# Altium footprint library Reflow3D1411sep.PcbLib: 657 footprints (part 1 of 42)
Each footprint in its own frame and in the unit in brackets; x right, y up, seen from the top. Pads: shape width x height; smd on the part's side, far side on the other; paste and mask are expansions set on the pad; w line width, h text height; cw(c..) or ccw(c..) is an arc to the next point about the centre after c.
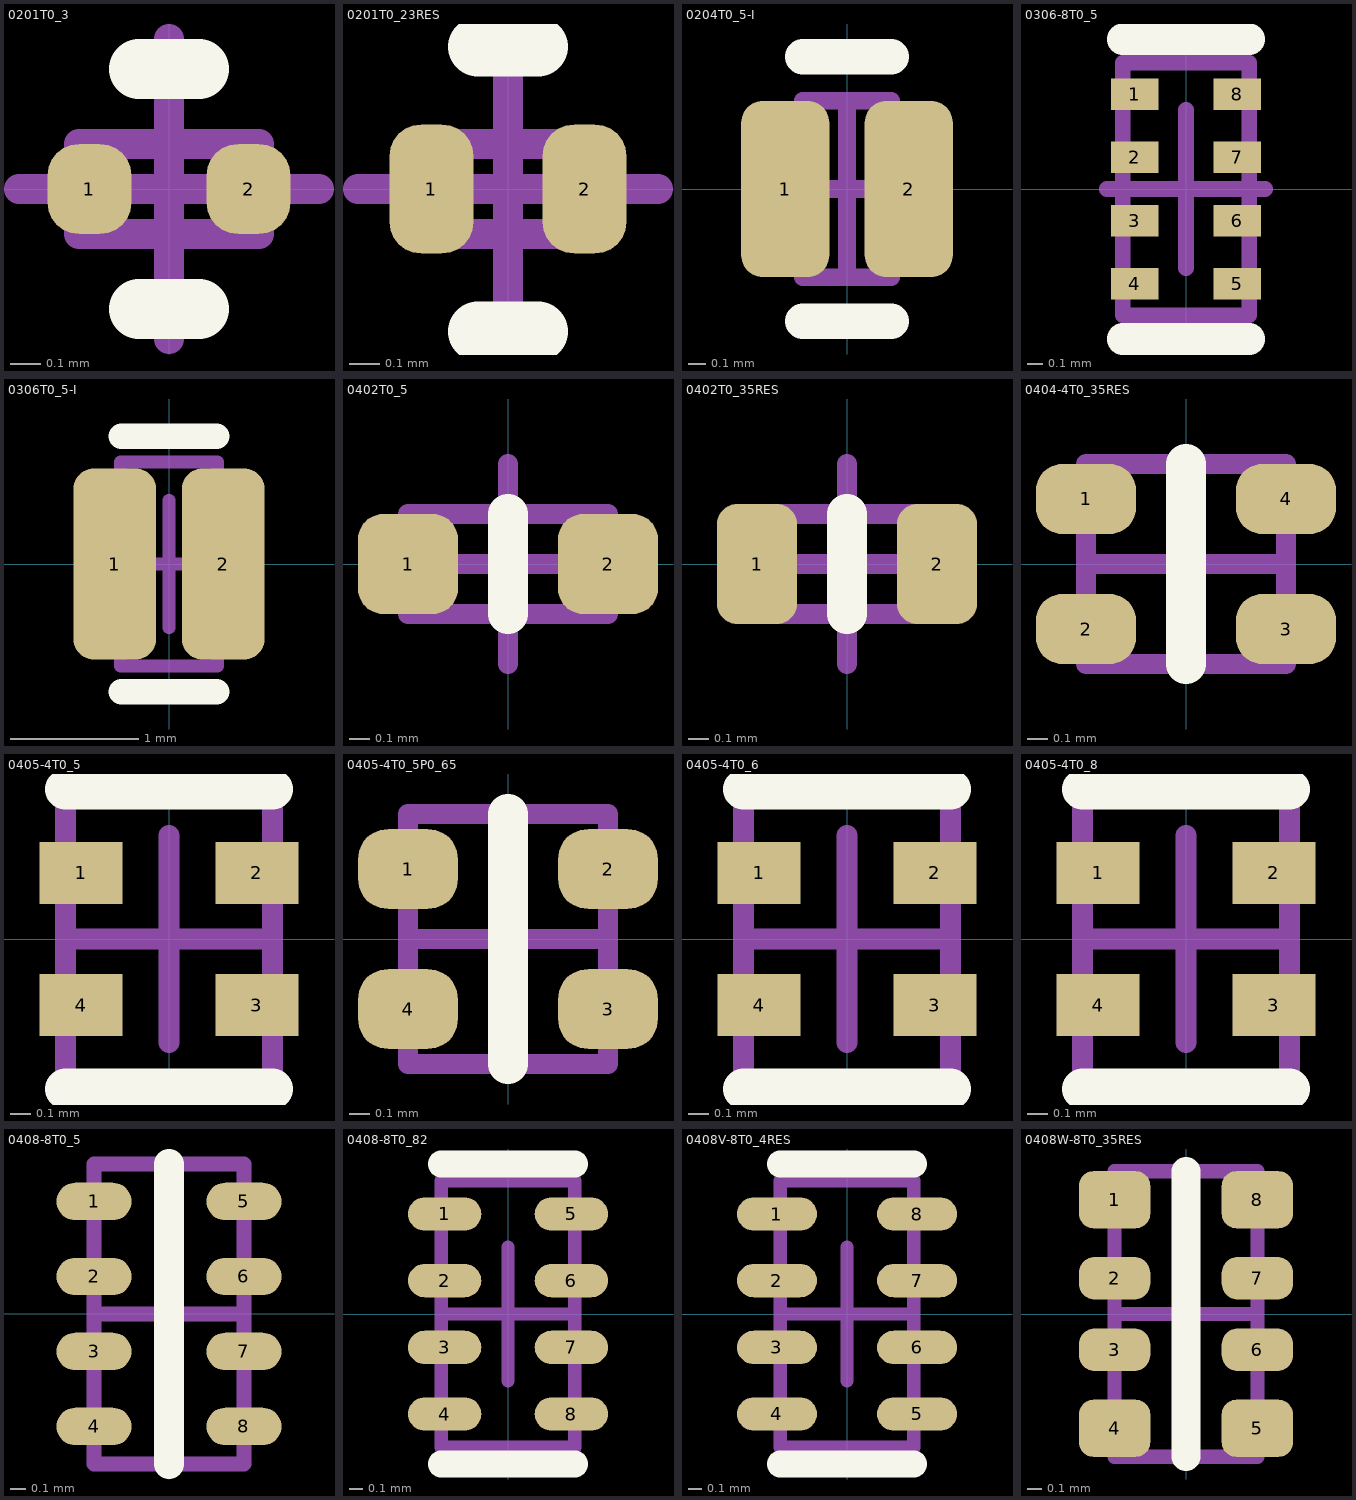
[diagram p0: the footprints below, top view; thin cyan lines are the x and y axes]

## 0201T0_3 [mm] "www.yageo.com, UPY-C_GEN_12.pdf; www.kemet.com, F3102_C0G.pdf"
height 0.3
pads (2):
  rrect75% 0.28x0.3 smd mask+0.05: 1(-0.265,0) 2(0.265,0)
Top Overlay:
  lines w0.2: -0.1,-0.4 0.1,-0.4 ; -0.1,0.4 0.1,0.4
Mechanical 13:
  lines w0.1: -0.3,-0.15 -0.3,0.15 0.3,0.15 0.3,-0.15 -0.3,-0.15
Mechanical 15:
  lines w0.1: -0.5,0 0.5,0 ; 0,-0.5 0,0.5
3D body: height 0.33, standoff 0, extent -0.315,-0.165 0.315,0.165

## 0201T0_23RES [mm] "www.vishay.com, dcrcwe3.pdf"
height 0.23
pads (2):
  rrect75% 0.28x0.43 smd mask+0.05: 1(-0.255,0) 2(0.255,0)
Top Overlay:
  lines w0.2: -0.1,-0.475 0.1,-0.475 ; -0.1,0.475 0.1,0.475
Mechanical 13:
  lines w0.1: -0.3,-0.15 -0.3,0.15 0.3,0.15 0.3,-0.15 -0.3,-0.15
Mechanical 15:
  lines w0.1: -0.5,0 0.5,0 ; 0,-0.5 0,0.5
3D body: height 0.28, standoff 0, extent -0.325,-0.175 0.325,0.175

## 0204T0_5-I [mm] "www.avx.com, smccp.pdf, LG12"
height 0.5
pads (2):
  rrect50% 0.5x1 smd mask+0.05: 1(-0.35,0) 2(0.35,0)
Top Overlay:
  lines w0.2: -0.25,-0.75 0.25,-0.75 ; -0.25,0.75 0.25,0.75
Mechanical 13:
  lines w0.1: -0.25,-0.5 -0.25,0.5 0.25,0.5 0.25,-0.5 -0.25,-0.5
Mechanical 15:
  lines w0.1: -0.5,0 0.5,0 ; 0,-0.5 0,0.5
3D body: height 0.55, standoff 0, extent -0.275,-0.55 0.275,0.55

## 0306-8T0_5 [mm] "www.murata.com, c02e.pdf, LLA185"
height 0.5
pads (8):
  rect 0.3x0.2 smd mask+0.05: 1(-0.325,0.6) 2(-0.325,0.2) 3(-0.325,-0.2) 4(-0.325,-0.6) 5(0.325,-0.6) 6(0.325,-0.2) 7(0.325,0.2) 8(0.325,0.6)
Top Overlay:
  lines w0.2: -0.4,-0.95 0.4,-0.95 ; -0.4,0.95 0.4,0.95
Mechanical 13:
  lines w0.1: -0.4,-0.8 -0.4,0.8 0.4,0.8 0.4,-0.8 -0.4,-0.8
Mechanical 15:
  lines w0.1: -0.5,0 0.5,0 ; 0,-0.5 0,0.5
3D body: height 0.55, standoff 0, extent -0.45,-0.85 0.45,0.85

## 0306T0_5-I [mm] "www.avx.com, smccp.pdf, LG22"
height 0.5
pads (2):
  rrect50% 0.65x1.5 smd mask+0.05: 1(-0.425,0) 2(0.425,0)
Top Overlay:
  lines w0.2: -0.375,-1 0.375,-1 ; -0.375,1 0.375,1
Mechanical 13:
  lines w0.1: -0.38,-0.8 -0.38,0.8 0.38,0.8 0.38,-0.8 -0.38,-0.8
Mechanical 15:
  lines w0.1: -0.5,0 0.5,0 ; 0,-0.5 0,0.5
3D body: height 0.55, standoff 0, extent -0.43,-0.85 0.43,0.85

## 0402T0_5 [mm] "www.yageo.com, UPY-C_GEN_12.pdf; www.kemet.com, F3102_C0G.pdf"
height 0.5
pads (2):
  rrect50% 0.5x0.5 smd mask+0.075: 1(-0.5,0) 2(0.5,0)
Top Overlay:
  lines w0.2: 0,-0.25 0,0.25
Mechanical 13:
  lines w0.1: -0.5,-0.25 0.5,-0.25 0.5,0.25 -0.5,0.25 -0.5,-0.25
Mechanical 15:
  lines w0.1: -0.5,0 0.5,0 ; 0,-0.5 0,0.5
3D body: height 0.55, standoff 0, extent -0.525,-0.275 0.525,0.275

## 0402T0_35RES [mm] "www.vishay.com, dcrcwe3.pdf"
height 0.35
pads (2):
  rrect50% 0.4x0.6 smd mask+0.075: 1(-0.45,0) 2(0.45,0)
Top Overlay:
  lines w0.2: 0,-0.25 0,0.25
Mechanical 13:
  lines w0.1: -0.5,-0.25 0.5,-0.25 0.5,0.25 -0.5,0.25 -0.5,-0.25
Mechanical 15:
  lines w0.1: -0.5,0 0.5,0 ; 0,-0.5 0,0.5
3D body: height 0.4, standoff 0, extent -0.525,-0.275 0.525,0.275

## 0404-4T0_35RES [mm] "www.bourns.com, CAY10.pdf"
height 0.35
pads (4):
  rrect75% 0.5x0.35 smd mask+0.075: 1(-0.5,0.325) 2(-0.5,-0.325) 3(0.5,-0.325) 4(0.5,0.325)
Top Overlay:
  lines w0.2: 0,-0.5 0,0.5
Mechanical 13:
  lines w0.1: -0.5,-0.5 0.5,-0.5 0.5,0.5 -0.5,0.5 -0.5,-0.5
Mechanical 15:
  lines w0.1: -0.5,0 0.5,0 ; 0,-0.5 0,0.5
3D body: height 0.45, standoff 0, extent -0.55,-0.55 0.55,0.55

## 0405-4T0_5 [mm] "www.murata.com, c02e.pdf, GNM1M2"
height 0.5
pads (4):
  rect 0.4x0.3 smd mask+0.075: 1(-0.425,0.32) 2(0.425,0.32) 3(0.425,-0.32) 4(-0.425,-0.32)
Top Overlay:
  lines w0.2: -0.5,-0.725 0.5,-0.725 ; -0.5,0.725 0.5,0.725
Mechanical 13:
  lines w0.1: -0.5,-0.685 -0.5,0.685 0.5,0.685 0.5,-0.685 -0.5,-0.685
Mechanical 15:
  lines w0.1: -0.5,0 0.5,0 ; 0,-0.5 0,0.5
3D body: height 0.55, standoff 0, extent -0.575,-0.76 0.575,0.76

## 0405-4T0_5P0_65 [mm] "www.murata.com, c31e.pdf, DLM11G"
height 0.5
pads (4):
  rrect75% 0.5x0.4 smd mask+0.075: 1(-0.5,0.35) 2(0.5,0.35) 3(0.5,-0.35) 4(-0.5,-0.35)
Top Overlay:
  lines w0.2: 0,-0.625 0,0.625
Mechanical 13:
  lines w0.1: -0.5,-0.625 -0.5,0.625 0.5,0.625 0.5,-0.625 -0.5,-0.625
Mechanical 15:
  lines w0.1: -0.5,0 0.5,0 ; 0,-0.5 0,0.5
3D body: height 0.6, standoff 0, extent -0.575,-0.7 0.575,0.7

## 0405-4T0_6 [mm] "www.murata.com, c02e.pdf, GNM1M2"
height 0.6
pads (4):
  rect 0.4x0.3 smd mask+0.075: 1(-0.425,0.32) 2(0.425,0.32) 3(0.425,-0.32) 4(-0.425,-0.32)
Top Overlay:
  lines w0.2: -0.5,-0.725 0.5,-0.725 ; -0.5,0.725 0.5,0.725
Mechanical 13:
  lines w0.1: -0.5,-0.685 -0.5,0.685 0.5,0.685 0.5,-0.685 -0.5,-0.685
Mechanical 15:
  lines w0.1: -0.5,0 0.5,0 ; 0,-0.5 0,0.5
3D body: height 0.7, standoff 0, extent -0.575,-0.76 0.575,0.76

## 0405-4T0_8 [mm] "www.murata.com, c02e.pdf, GNM1M2"
height 0.8
pads (4):
  rect 0.4x0.3 smd mask+0.075: 1(-0.425,0.32) 2(0.425,0.32) 3(0.425,-0.32) 4(-0.425,-0.32)
Top Overlay:
  lines w0.2: -0.5,-0.725 0.5,-0.725 ; -0.5,0.725 0.5,0.725
Mechanical 13:
  lines w0.1: -0.5,-0.685 0.5,-0.685 0.5,0.685 -0.5,0.685 -0.5,-0.685
Mechanical 15:
  lines w0.1: -0.5,0 0.5,0 ; 0,-0.5 0,0.5
3D body: height 0.8, standoff 0, extent -0.575,-0.76 0.575,0.76

## 0408-8T0_5 [mm] "www.murata.com, c31e.pdf, BLA2AA/BLA2AB"
height 0.5
pads (8):
  oval 0.5x0.25 smd mask+0.05: 1(-0.5,0.75) 2(-0.5,0.25) 3(-0.5,-0.25) 4(-0.5,-0.75) 5(0.5,0.75) 6(0.5,0.25) 7(0.5,-0.25) 8(0.5,-0.75)
Top Overlay:
  lines w0.2: 0,-1 0,1
Mechanical 13:
  lines w0.1: -0.5,-1 0.5,-1 0.5,1 -0.5,1 -0.5,-1
Mechanical 15:
  lines w0.1: -0.5,0 0.5,0 ; 0,-0.5 0,0.5
3D body: height 0.6, standoff 0, extent -0.6,-1.1 0.6,1.1

## 0408-8T0_82 [mm] "www.murata.com, c31e.pdf, DLP2AD"
height 0.82
pads (8):
  oval 0.55x0.25 smd mask+0.05: 1(-0.475,0.75) 2(-0.475,0.25) 3(-0.475,-0.25) 4(-0.475,-0.75) 5(0.475,0.75) 6(0.475,0.25) 7(0.475,-0.25) 8(0.475,-0.75)
Top Overlay:
  lines w0.2: -0.5,-1.125 0.5,-1.125 ; -0.5,1.125 0.5,1.125
Mechanical 13:
  lines w0.1: -0.5,-1 0.5,-1 0.5,1 -0.5,1 -0.5,-1
Mechanical 15:
  lines w0.1: -0.5,0 0.5,0 ; 0,-0.5 0,0.5
3D body: height 0.92, standoff 0, extent -0.55,-1.05 0.55,1.05

## 0408V-8T0_4RES [mm] "www.bourns.com, CAT10.pdf"
height 0.4
pads (8):
  oval 0.6x0.25 smd mask+0.05: 1(-0.525,0.75) 2(-0.525,0.25) 3(-0.525,-0.25) 4(-0.525,-0.75) 5(0.525,-0.75) 6(0.525,-0.25) 7(0.525,0.25) 8(0.525,0.75)
Top Overlay:
  lines w0.2: -0.5,-1.125 0.5,-1.125 ; -0.5,1.125 0.5,1.125
Mechanical 13:
  lines w0.1: -0.5,-1 -0.5,1 0.5,1 0.5,-1 -0.5,-1
Mechanical 15:
  lines w0.1: -0.5,0 0.5,0 ; 0,-0.5 0,0.5
3D body: height 0.55, standoff 0, extent -0.55,-1.05 0.55,1.05

## 0408W-8T0_35RES [mm] "www.vishay.com, cra04s.pdf; www.bourns.com, CAY10.pdf"
height 0.35
pads (8):
  rrect50% 0.5x0.4 smd mask+0.05: 1(-0.5,0.8) 4(-0.5,-0.8) 5(0.5,-0.8) 8(0.5,0.8)
  rrect75% 0.5x0.3 smd mask+0.05: 2(-0.5,0.25) 3(-0.5,-0.25) 6(0.5,-0.25) 7(0.5,0.25)
Top Overlay:
  lines w0.2: 0,-1 0,1
Mechanical 13:
  lines w0.1: -0.5,-1 0.5,-1 0.5,1 -0.5,1 -0.5,-1
Mechanical 15:
  lines w0.1: -0.5,0 0.5,0 ; 0,-0.5 0,0.5
3D body: height 0.45, standoff 0, extent -0.55,-1.05 0.55,1.05